# Altium footprint library First Board IMX6.PcbLib: 204 footprints (part 6 of 13)
Each footprint in its own frame and in the unit in brackets; x right, y up, seen from the top. Pads: shape width x height; smd on the part's side, far side on the other; paste and mask are expansions set on the pad; w line width, h text height; cw(c..) or ccw(c..) is an arc to the next point about the centre after c.
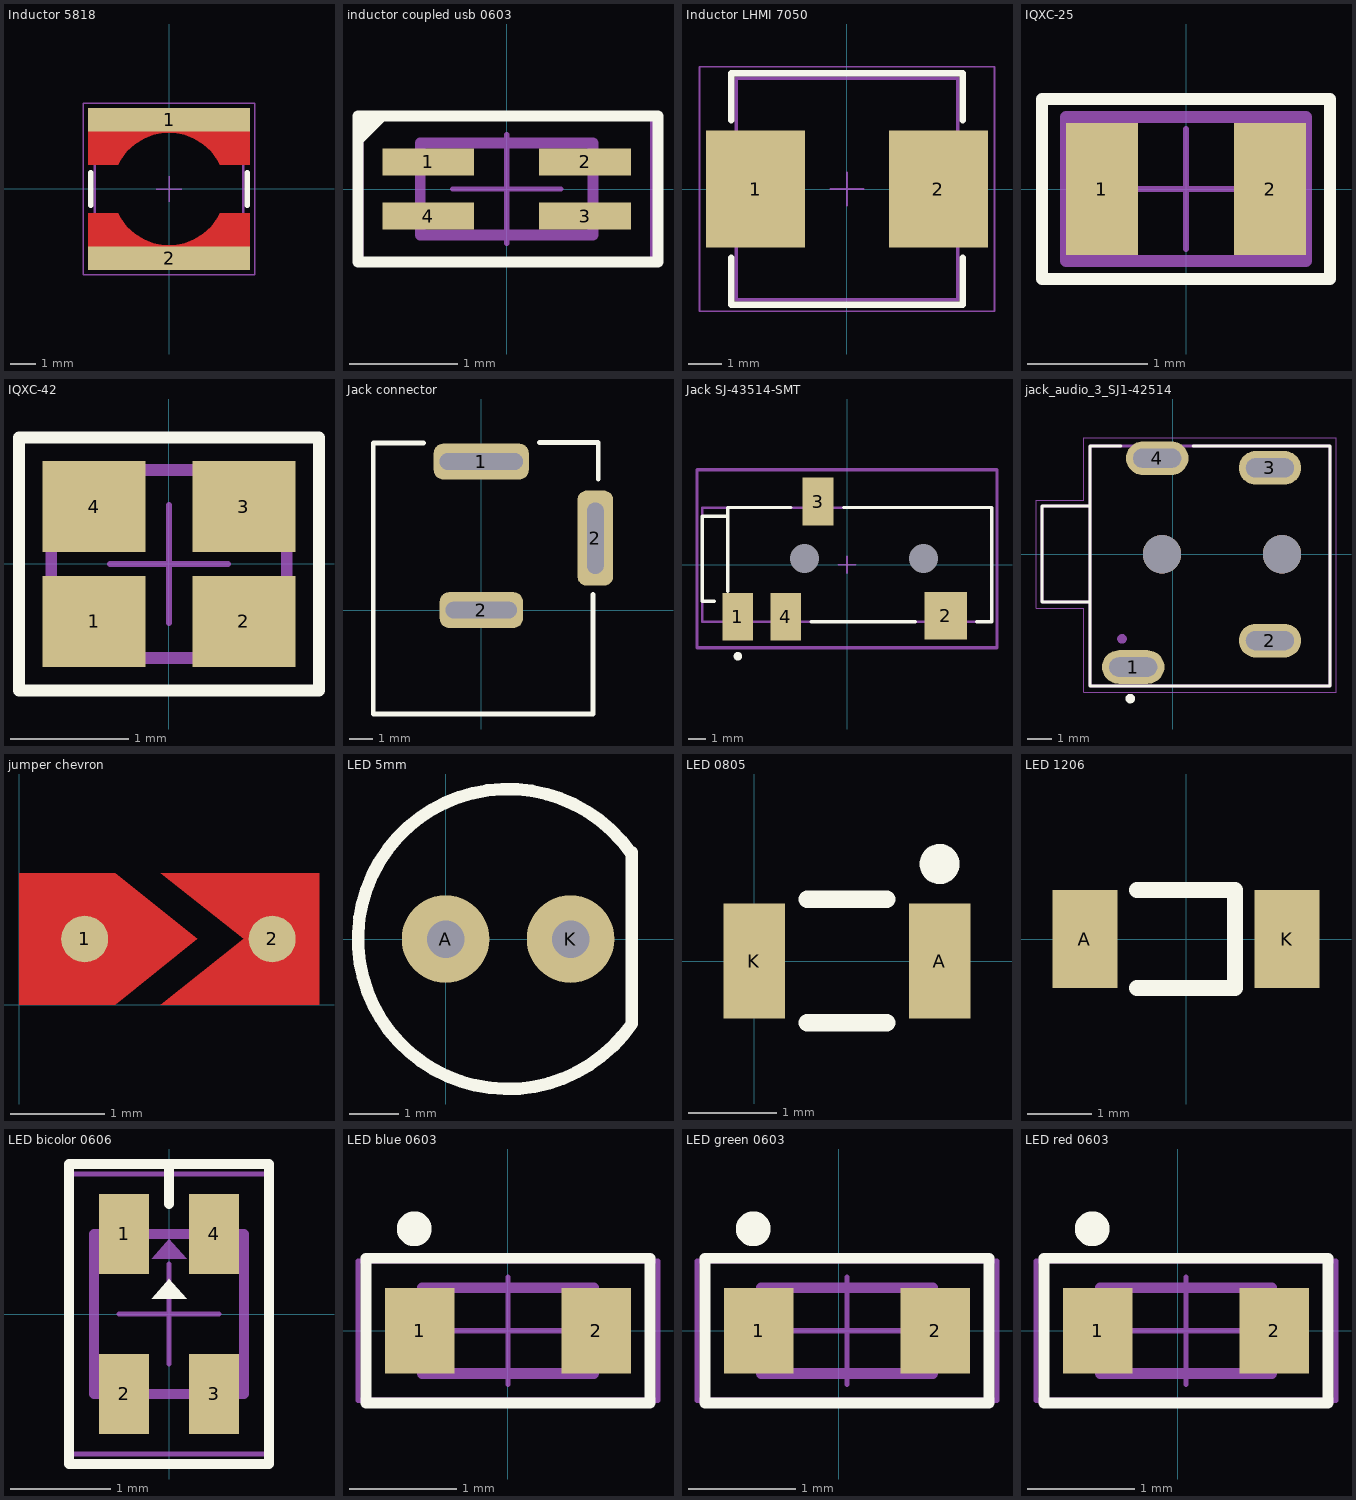
[diagram p5: the footprints below, top view; thin cyan lines are the x and y axes]

## Inductor 5818 [mm]
pads (2):
  rect 6.3x0.9 smd paste-403.566 mask-403.566: 1(0,2.7) 2(0,-2.7)
Top Layer:
  region: 3.15,-0.95 1.984,-0.95 1.887,-1.132 1.643,-1.463 1.342,-1.744 0.993,-1.963 0.61,-2.114 0.206,-2.19 -0.206,-2.19 -0.61,-2.114 -0.993,-1.963 -1.342,-1.744 -1.643,-1.463 -1.887,-1.132 -1.984,-0.95 -3.15,-0.95 -3.15,-3.15 3.15,-3.15
  region: -3.15,0.95 -1.984,0.95 -1.887,1.131 -1.643,1.463 -1.342,1.743 -0.993,1.963 -0.61,2.114 -0.206,2.19 0.206,2.19 0.61,2.114 0.993,1.963 1.341,1.744 1.643,1.463 1.887,1.132 1.984,0.95 3.15,0.95 3.15,3.15 -3.15,3.15
Top Overlay:
  lines w0.2: -3.05,-0.65 -3.05,0.65 ; 3.05,-0.65 3.05,0.65
Mechanical 13:
  lines w0.1: -2.9,-2.9 2.9,-2.9 2.9,2.9 -2.9,2.9 -2.9,-2.9
Mechanical 15:
  lines w0.05: -0.5,0 0.5,0 ; 0,-0.5 0,0.5 ; -3.35,-3.35 -3.35,3.35 3.35,3.35 3.35,-3.35 -3.35,-3.35
3D body "744052xxx.stp": height 1.8, standoff 0, extent -2.9,-2.9 2.9,2.9

## inductor coupled usb 0603 [mm]
pads (4):
  rect 0.85x0.25 smd: 1(-0.725,0.25) 2(0.725,0.25) 3(0.725,-0.25) 4(-0.725,-0.25)
Top Overlay:
  lines w0.1: -1.375,0.425 -1.375,0.45 -1.15,0.675 ; -1.375,0.5 -1.25,0.65 ; -1.35,0.65 -1.35,0.675 ; -1.375,-0.675 1.4,-0.675 1.4,0.675 -1.375,0.675 -1.375,-0.675
Mechanical 13:
  lines w0.1: -0.8,-0.425 0.8,-0.425 0.8,0.425 -0.8,0.425 -0.8,-0.425
Mechanical 15:
  lines w0.05: -0.5,0 0.5,0 ; 0,-0.5 0,0.5 ; -1.35,-0.675 1.35,-0.675 1.35,0.675 -1.35,0.675 -1.35,-0.675
3D body "0603_744230xxx.stp": height 1.09, standoff -0.01, extent -0.8,-0.425 0.8,0.425

## Inductor LHMI 7050 [mm]
pads (2):
  rect 2.95x3.5 smd: 1(-2.725,0) 2(2.725,0)
Top Overlay:
  lines w0.2: -3.45,-2.05 -3.45,-3.45 3.45,-3.45 3.45,-2.05 ; -3.45,2.05 -3.45,3.45 3.45,3.45 3.45,2.05
Top Assembly:
  lines w0.1: -3.3,-3.3 3.3,-3.3 3.3,3.3 -3.3,3.3 -3.3,-3.3
  text ".Designator" at -7.498,-0.5 h1.5
Top Courtyard:
  lines w0.05: -0.5,0 0.5,0 ; 0,-0.5 0,0.5 ; -4.4,-3.65 4.4,-3.65 4.4,3.65 -4.4,3.65 -4.4,-3.65
Top 3D Body:
  lines w0.1: -3.3,-3.3 3.3,-3.3 3.3,3.3 -3.3,3.3 -3.3,-3.3
3D body "STEP-WE-LHMI-7050-rev1.stp": height 4.8, standoff 0, extent -3.65,-3.3 3.65,3.3

## IQXC-25 [mm] "Quartz Crystal, size IQXC-25, body 2x1mm"
height 0.6
pads (2):
  rect 0.6x1.1 smd: 1(-0.7,0) 2(0.7,0)
Top Overlay:
  lines w0.1: -1.2,-0.75 -1.2,0.75 1.2,0.75 1.2,-0.75 -1.2,-0.75
Mechanical 11:
  lines w0.1: -1,-0.6 1,-0.6 1,0.6 -1,0.6 -1,-0.6
  text ".Designator" at -0.825,-0.35 h0.7
Mechanical 13:
  lines w0.1: -1,-0.6 -1,0.6 1,0.6 1,-0.6 -1,-0.6
Mechanical 15:
  lines w0.05: -0.5,0 0.5,0 ; 0,-0.5 0,0.5 ; -1.2,-0.75 -1.2,0.75 1.2,0.75 1.2,-0.75 -1.2,-0.75
3D body "FrqXTAL_IQXC-25.stp": height 0.55, standoff 0, extent -1,-0.6 1,0.6

## IQXC-42 [mm] "Quartz Crystal, size IQXC-42, body 2x1.6mm"
height 0.5
pads (4):
  rect 0.875x0.775 smd: 1(-0.637,-0.487) 2(0.638,-0.487) 3(0.638,0.487) 4(-0.637,0.487)
Top Overlay:
  lines w0.1: -1.275,-1.075 -1.275,-1.075 ; -1.275,-1.075 -1.275,1.075 1.275,1.075 1.275,-1.075 -1.275,-1.075
Mechanical 11:
  circle w0.075: c-0.6,-0.4 r0.15
  lines w0.1: -1,-0.8 1,-0.8 1,0.8 -1,0.8 -1,-0.8
  text ".Designator" at -0.825,-0.35 h0.7
Mechanical 13:
  lines w0.1: -1,-0.8 -1,0.8 1,0.8 1,-0.8 -1,-0.8
Mechanical 15:
  lines w0.05: -0.5,0 0.5,0 ; 0,-0.5 0,0.5 ; -1.275,-1.075 -1.275,1.075 1.275,1.075 1.275,-1.075 -1.275,-1.075
3D body "FrqXTAL_IQXC-42.stp": height 0.5, standoff 0, extent -1,-0.8 1,0.8

## Jack connector [mm]
pads (3):
  rrect50% 4x1.5 hole 0.7 slot 3.5 at 0 deg: 1(0,6.25)
  rrect50% 3.5x1.5 hole 0.7 slot 3 at 0 deg: 2(0,0)
  rrect50% 1.5x4 hole 0.7 slot 3 at 90 deg: 2(4.8,3.025)
Top Overlay:
  lines w0.2: -2.425,7.025 -4.55,7.025 -4.55,-4.375 4.7,-4.375 4.7,0.65 ; 2.45,7.05 4.925,7.05 4.925,5.5
3D body "Jack kycon kld-0202-a.step": height 11.38, standoff -3.4, extent -4.547,-7.439 4.925,7.039

## Jack SJ-43514-SMT [mm]
pads (6):
  rect 1.8x2.8 smd paste+0 mask+0: 1(-6.4,-3.05) 3(-1.7,3.7) 4(-3.6,-3.05)
  rect 2.5x2.8 smd paste+0 mask+0: 2(5.8,-3)
  round 0 hole 1.7 unplated paste-1000 mask+0: ""(-2.5,0.35) ""(4.5,0.35)
Top Overlay:
  circle w0.25: c-6.4,-5.375 r0.125
  lines w0.2: -7.8,-2.15 -8.5,-2.15 -8.5,2.85 -7,2.85 ; -7,-1.55 -7,2.85 ; -3.3,3.35 -7,3.35 -7,2.85 ; -2.1,-3.35 4,-3.35 ; -0.2,3.35 8.5,3.35 8.5,-3.35 7.6,-3.35
Mechanical 10:
  lines w0.2: -8.8,-4.875 -8.8,5.575 8.8,5.575 8.8,-4.875 -8.8,-4.875
  text ".Designator" at 0,0.35 h1
Bottom Assembly:
  lines w0.15: -8.5,-3.35 -8.5,3.35 8.5,3.35 8.5,-3.35 -8.5,-3.35
Mechanical 15:
  lines w0.1: -0.5,0 0.5,0 ; 0,-0.5 0,0.5
  lines w0.2: -8.8,-4.875 -8.8,5.575 8.8,5.575 8.8,-4.875 -8.8,-4.875
3D body "3dmodel.step": height 5.11, standoff -0.69, extent -8.702,-4.142 8.497,4.858

## jack_audio_3_SJ1-42514 [mm]
pads (6):
  oval 2.6x1.4 hole 0.8 slot 2 at 0 deg: 1(-1.651,-4.699) 2(4.049,-3.599) 3(4.049,3.601) 4(-0.651,4.001)
  round 1.6 hole 1.6 unplated: ""(-0.451,0.001) ""(4.549,0.001)
Top Overlay:
  circle w0.2: c-1.773,-6.014 r0.1
  lines w0.127: -2.151,4.501 -3.451,4.501 -3.451,2.001 ; 0.849,4.501 6.549,4.501 6.549,-5.499 -3.451,-5.499 -3.451,-1.999 ; -3.451,-1.999 -5.451,-1.999 -5.451,2.001 -3.451,2.001 ; -3.451,-1.999 -3.451,2.001
Mechanical 13:
  circle w0.2: c-2.118,-3.524 r0.1
  lines w0.127: -3.451,-1.999 -5.451,-1.999 -5.451,2.001 -3.451,2.001 ; -3.451,-1.999 -3.451,2.001 ; -3.451,-1.999 -3.451,-5.499 6.549,-5.499 6.549,4.501 -3.451,4.501 -3.451,2.001
Mechanical 15:
  lines w0.05: -5.701,-2.249 -5.701,2.251 -3.701,2.251 -3.701,4.851 6.799,4.851 6.799,-5.749 -3.701,-5.749 -3.701,-2.249 -5.701,-2.249
3D body "jack_3ring_CUI_DEVICES_SJ1-42514.step": height 4.3, standoff -2.2, extent -5.5,-5.5 6.5,4.5

## jumper chevron [mm]
pads (2):
  round 0.5 smd: 1(0.7,0.7) 2(2.7,0.7)
Top Layer:
  region: 0,0 0,1.4 1.025,1.4 1.9,0.7 1.025,0
  region: 1.512,1.4 3.2,1.4 3.2,0 1.513,0 2.4,0.7

## LED 5mm [mil]
pads (2):
  round 70 hole 30: A(0,0) K(100,0)
Top Overlay:
  lines w10: 147.99,69.26 ccw(c50,0) 149.04,-67.76 149.04,69.26
3D body "LED-5mm.STEP": height 494.75, standoff -87.93, extent -67.31,-118.49 146.08,118.5

## LED 0805 [mm]
pads (2):
  rect 0.7x1.3 smd: A(2.1,0) K(0,0)
Top Overlay:
  circle w0.254: c2.1,1.1 r0.1
  lines w0.2: 0.6,-0.7 1.5,-0.7 ; 0.6,0.7 1.5,0.7
3D body "0805 LED.step": height 1.1, standoff -0.01, extent 0.1,-0.625 2.1,0.625

## LED 1206 [mil]
pads (2):
  rect 40x60 smd: A(-62,0) K(62,0)
Top Overlay:
  lines w10: -30,-30 30,-30 30,30 -30,30
3D body "CAPACITOR 1206.step": height 32.35, standoff 1.65, extent -62.99,-31.49 63,31.5

## LED bicolor 0606 [mm]
pads (4):
  rect 0.5x0.8 smd: 1(-0.45,0.8) 2(-0.45,-0.8) 3(0.45,-0.8) 4(0.45,0.8)
Top Overlay:
  region: -0.175,0.15 0.003,0.353 -0.003,0.353 0.175,0.15
  lines w0.1: 0,1.1 0,1.5 ; -1,-1.5 1,-1.5 1,1.5 -1,1.5 -1,-1.5
Mechanical 13:
  region: -0.175,0.55 0.003,0.753 -0.003,0.753 0.175,0.55
  lines w0.1: -0.75,-0.8 -0.75,0.8 0.75,0.8 0.75,-0.8 -0.75,-0.8
Mechanical 15:
  lines w0.05: -0.5,0 0.5,0 ; 0,-0.5 0,0.5 ; -1,-1.4 1,-1.4 1,1.4 -1,1.4 -1,-1.4
3D body "150066xx54050.stp": height 0.55, standoff 0, extent -0.75,-0.8 0.75,0.8

## LED blue 0603 [mm]
pads (2):
  rect 0.65x0.8 smd: 1(-0.825,0) 2(0.825,0)
Top Overlay:
  circle w0.254: c-0.875,0.95 r0.035
  lines w0.1: -1.325,-0.675 -1.325,0.675 1.225,0.675 1.325,0.675 1.325,-0.675 -1.325,-0.675
Mechanical 13:
  lines w0.1: -0.8,-0.4 0.8,-0.4 0.8,0.4 -0.8,0.4 -0.8,-0.4
Mechanical 15:
  lines w0.05: -0.5,0 0.5,0 ; 0,-0.5 0,0.5 ; -1.4,-0.65 -1.4,0.65 1.4,0.65 1.4,-0.65 -1.4,-0.65
3D body "LED blue 0603.STEP": height 0.8, standoff 0, extent -0.825,-0.4 0.775,0.4

## LED green 0603 [mm]
pads (2):
  rect 0.65x0.8 smd: 1(-0.75,0) 2(0.9,0)
Top Overlay:
  circle w0.254: c-0.8,0.95 r0.035
  lines w0.1: -1.25,-0.675 -1.25,0.675 1.3,0.675 1.4,0.675 1.4,-0.675 -1.25,-0.675
Mechanical 13:
  lines w0.1: -0.725,-0.4 0.875,-0.4 0.875,0.4 -0.725,0.4 -0.725,-0.4
Mechanical 15:
  lines w0.05: -0.425,0 0.575,0 ; 0.075,-0.5 0.075,0.5 ; -1.325,-0.65 -1.325,0.65 1.475,0.65 1.475,-0.65 -1.325,-0.65
3D body "led green 0603.step": height 0.8, standoff 0, extent -0.7,-0.375 0.9,0.425

## LED red 0603 [mm]
pads (2):
  rect 0.65x0.8 smd: 1(-0.75,0) 2(0.9,0)
Top Overlay:
  circle w0.254: c-0.8,0.95 r0.035
  lines w0.1: -1.25,-0.675 -1.25,0.675 1.3,0.675 1.4,0.675 1.4,-0.675 -1.25,-0.675
Mechanical 13:
  lines w0.1: -0.725,-0.4 0.875,-0.4 0.875,0.4 -0.725,0.4 -0.725,-0.4
Mechanical 15:
  lines w0.05: -0.425,0 0.575,0 ; 0.075,-0.5 0.075,0.5 ; -1.325,-0.65 -1.325,0.65 1.475,0.65 1.475,-0.65 -1.325,-0.65
3D body "Led red 0603.step": height 0.8, standoff 0, extent -0.725,-0.375 0.875,0.425